# Altium schematic symbol library Sang_library.SchLib: 1607 symbols (part 9 of 15)
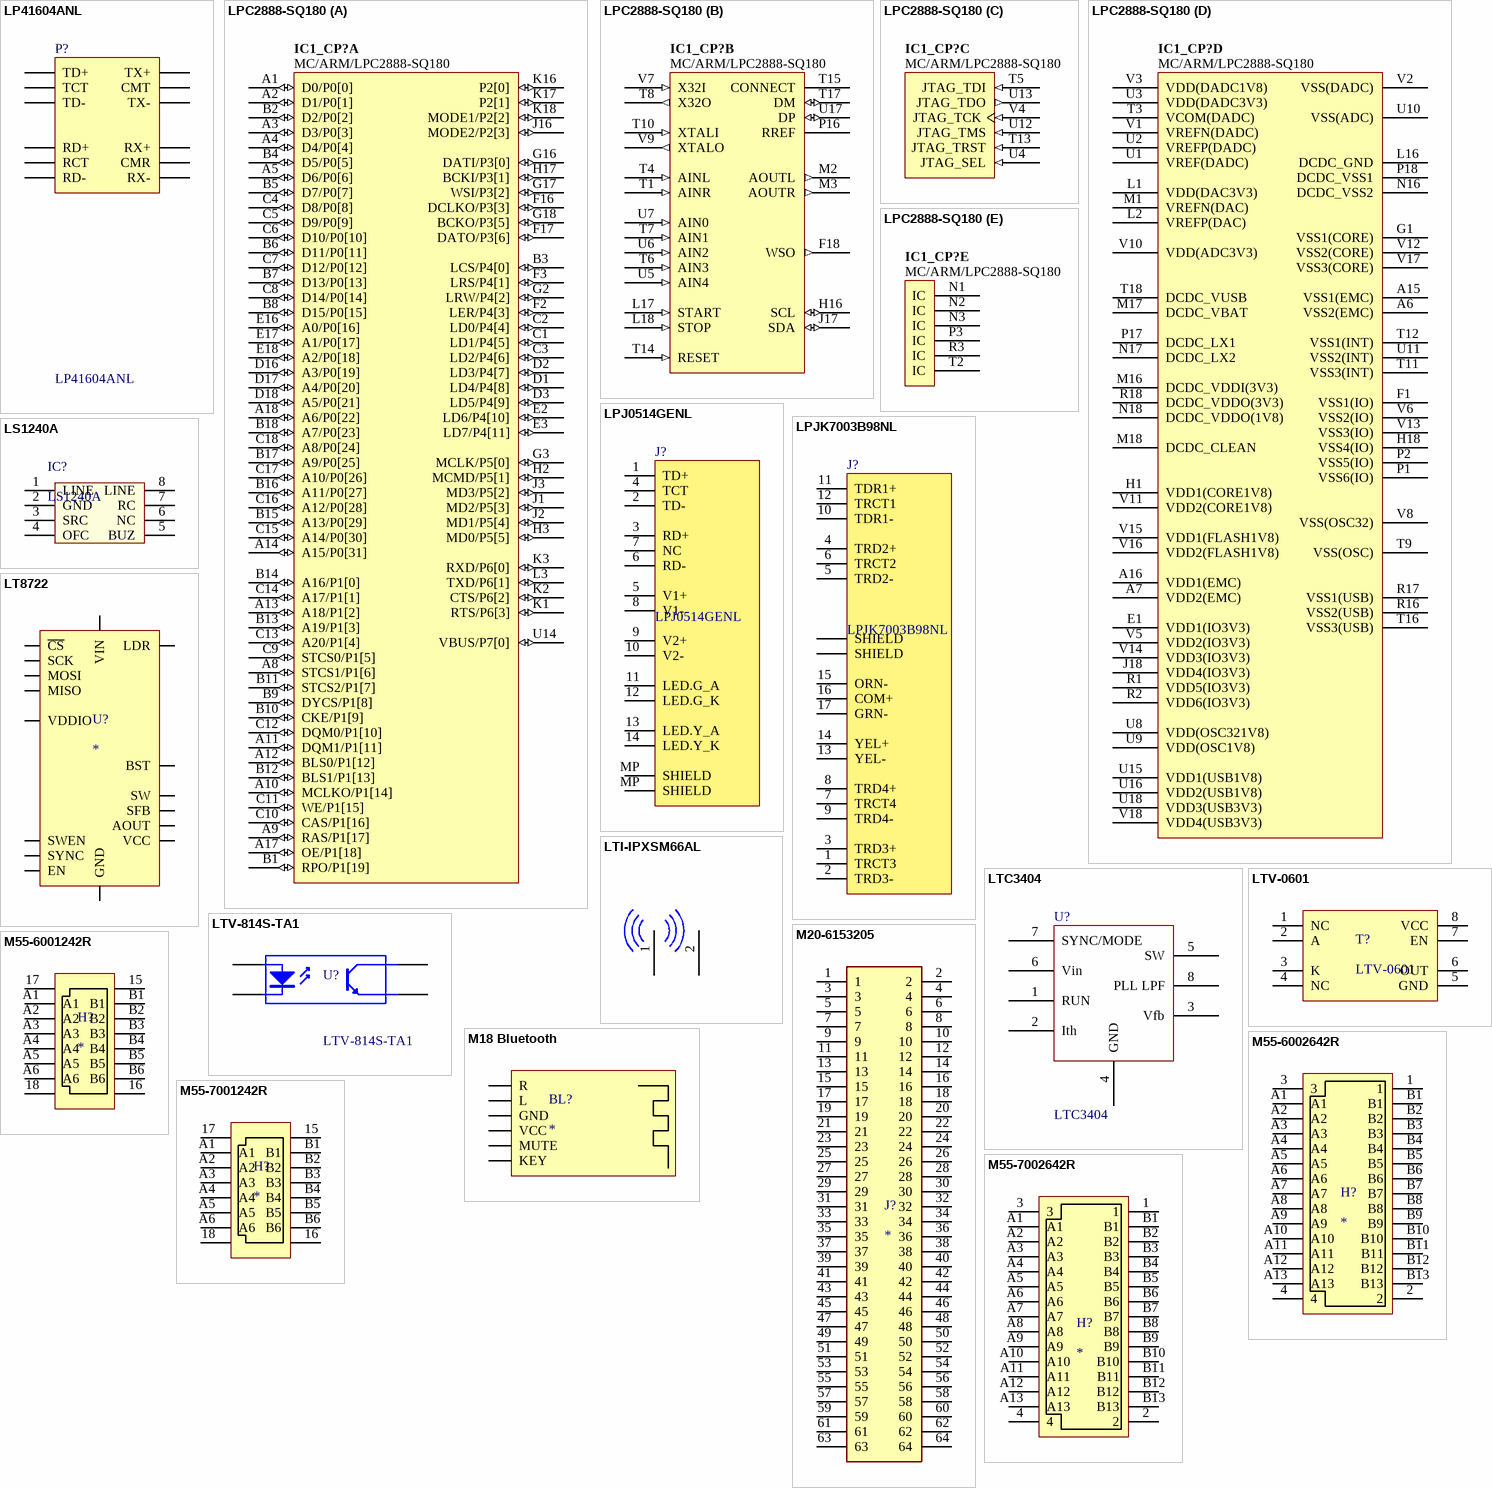
[diagram p105: symbols LP41604ANL to M55-7002642R]

## LPC2888-SQ180
designator IC1_CP?, comment MC/ARM/LPC2888-SQ180
16/32-bit ARM microcontrollers; 8 kB cache, up to 1 MB flash,  High Speed USB 2.0 device, and SDRAM memory interface; Bit Width: Bits; Max Clock Frequency: Hz; Supply Voltage: mV; Mounting Technology: Surface Mount; Status: Unreleased; Category: IC-MCU
footprint BGA180 (BGA, 180-Leads, Body 10x10mm, Pitch 0.5mm)
part A pins: A1 D0/P0[0] (io) "external memory data bus, low byte (I/O); GPIO pin", A2 D1/P0[1] (io) "external memory data bus, low byte (I/O); GPIO pin", A3 D3/P0[3] (io) "external memory data bus, low byte (I/O); GPIO pin", A4 D4/P0[4] (io) "external memory data bus, low byte (I/O); GPIO pin", A5 D6/P0[6] (io) "external memory data bus, low byte (I/O); GPIO pin", A8 STCS1/P1[6] (io) "chip select, active LOW for static memory bank 1; GPIO pin", A9 RAS/P1[17] (io) "row address strobe, active LOW for SDRAM; GPIO pin", A10 MCLKO/P1[14] (io) "clock for SDRAM and SyncFlash memory; GPIO pin", A11 DQM1/P1[11] (io) "data mask output for D[15:8], active HIGH for SDRAM; GPIO pin", A12 BLS0/P1[12] (io) "byte lane select for D[7:0], active LOW for static memory; GPIO pin", A13 A18/P1[2] (io) "address bus for static memory; GPIO pins", A14 A15/P0[31] (io) "address bus for static memory; GPIO pins", A17 OE/P1[18] (io) "output enable, active LOW for static memory; GPIO pin", A18 A6/P0[22] (io) "address bus for SDRAM and static memory; GPIO pins", B1 RPO/P1[19] (io) "reset power down, active LOW for SyncFlash memory; GPIO pin", B2 D2/P0[2] (io) "external memory data bus, low byte (I/O); GPIO pin", B3 LCS/P4[0] (io) "chip select to LCD device, programmable polarity; 5 V tolerant GPIO pin", B4 D5/P0[5] (io) "external memory data bus, low byte (I/O); GPIO pin", B5 D7/P0[7] (io) "external memory data bus, low byte (I/O); GPIO pin", B6 D11/P0[11] (io) "external memory data bus, high byte (I/O); GPIO pin", B7 D13/P0[13] (io) "external memory data bus, high byte (I/O); GPIO pin", B8 D15/P0[15] (io) "external memory data bus, high byte (I/O); GPIO pin", B9 DYCS/P1[8] (io) "chip select, active LOW for SDRAM; GPIO pin", B10 CKE/P1[9] (io) "clock enable; active HIGH for SDRAM; GPIO pin", B11 STCS2/P1[7] (io) "chip select, active LOW for static memory bank 2; GPIO pin", B12 BLS1/P1[13] (io) "byte lane select for D[15:8], active LOW for static memory; GPIO pin", B13 A19/P1[3] (io) "address bus for static memory; GPIO pins", B14 A16/P1[0] (io) "address bus for static memory; GPIO pins", B15 A13/P0[29] (io) "address bus for SDRAM and static memory; GPIO pins", B16 A11/P0[27] (io) "address bus for SDRAM and static memory; GPIO pins", B17 A9/P0[25] (io) "address bus for SDRAM and static memory; GPIO pins", B18 A7/P0[23] (io) "address bus for SDRAM and static memory; GPIO pins", C1 LD1/P4[5] (io) "data bus to/from LCD (I/O) or 5 V tolerant GPIO pin", C2 LD0/P4[4] (io) "data bus to/from LCD (I/O) or 5 V tolerant GPIO pin", C3 LD2/P4[6] (io) "data bus to/from LCD (I/O) or 5 V tolerant GPIO pin", C4 D8/P0[8] (io) "external memory data bus, high byte (I/O); GPIO pin", C5 D9/P0[9] (io) "external memory data bus, high byte (I/O); GPIO pin", C6 D10/P0[10] (io) "external memory data bus, high byte (I/O); GPIO pin", C7 D12/P0[12] (io) "external memory data bus, high byte (I/O); GPIO pin", C8 D14/P0[14] (io) "external memory data bus, high byte (I/O); GPIO pin", C9 STCS0/P1[5] (io) "chip select, active LOW for static memory bank 0; GPIO pin", C10 CAS/P1[16] (io) "column address strobe, active LOW for SDRAM; GPIO pin", C11 WE/P1[15] (io) "write enable, active LOW for SDRAM and static memory; GPIO pin", C12 DQM0/P1[10] (io) "data mask output for D[7:0], active HIGH for SDRAM; GPIO pin", C13 A20/P1[4] (io) "address bus for static memory; GPIO pins", C14 A17/P1[1] (io) "address bus for static memory; GPIO pins", C15 A14/P0[30] (io) "address bus for SDRAM and static memory; GPIO pins", C16 A12/P0[28] (io) "address bus for SDRAM and static memory; GPIO pins", C17 A10/P0[26] (io) "address bus for SDRAM and static memory; GPIO pins", C18 A8/P0[24] (io) "address bus for SDRAM and static memory; GPIO pins", D1 LD4/P4[8] (io) "data bus to/from LCD (I/O) or 5 V tolerant GPIO pin", D2 LD3/P4[7] (io) "data bus to/from LCD (I/O) or 5 V tolerant GPIO pin", D3 LD5/P4[9] (io) "data bus to/from LCD (I/O) or 5 V tolerant GPIO pin", D16 A3/P0[19] (io) "address bus for SDRAM and static memory; GPIO pins", D17 A4/P0[20] (io) "address bus for SDRAM and static memory; GPIO pins", D18 A5/P0[21] (io) "address bus for SDRAM and static memory; GPIO pins", E2 LD6/P4[10] (io) "data bus to/from LCD (I/O) or 5 V tolerant GPIO pin", E3 LD7/P4[11] (io) "data bus to/from LCD (I/O) or 5 V tolerant GPIO pin", E16 A0/P0[16] (io) "address bus for SDRAM and static memory; GPIO pins", E17 A1/P0[17] (io) "address bus for SDRAM and static memory; GPIO pins", E18 A2/P0[18] (io) "address bus for SDRAM and static memory; GPIO pins", F2 LER/P4[3] (io) "6800 E or 8080 RDor 5 V tolerant GPIO pin", F3 LRS/P4[1] (io) "‘HIGH?data register select, ‘LOW?instruction register select, or 5 V tolerant GPIO pin", F16 DCLKO/P3[3] (io) "256 ×clock output; 5 V tolerant GPIO pin", F17 DATO/P3[6] (io) "DAO serial data output; 5 V tolerant GPIO pin", G2 LRW/P4[2] (io) "6800 W/Ror 8080 WRor 5 V tolerant GPIO pin", G3 MCLK/P5[0] (io) "MCI clock output; 5 V tolerant GPIO pin", G16 DATI/P3[0] (io) "DAI serial data input; 5 V tolerant GPIO pin", G17 WSI/P3[2] (io) "DAI word select; 5 V tolerant GPIO pin", G18 BCKO/P3[5] (io) "DAO bit clock; 5 V tolerant GPIO pin", H2 MCMD/P5[1] (io) "command (I/O); 5 V tolerant GPIO pin", H3 MD0/P5[5] (io) "data bus from/to MCI/SD card (I/O); 5 V tolerant GPIO pin", H17 BCKI/P3[1] (io) "DAI bit clock; 5 V tolerant GPIO pin", J1 MD2/P5[3] (io) "data bus from/to MCI/SD card (I/O); 5 V tolerant GPIO pin", J2 MD1/P5[4] (io) "data bus from/to MCI/SD card (I/O); 5 V tolerant GPIO pin", J3 MD3/P5[2] (io) "data bus from/to MCI/SD card (I/O); 5 V tolerant GPIO pin", J16 MODE2/P2[3] (io) "start up MODE PIN2 (pull down); 5 V tolerant GPIO pin", K1 RTS/P6[3] (io) "request to send or receive flow control, active LOW; 5 V tolerant GPIO pin", K2 CTS/P6[2] (io) "clear to send or transmit flow control, active LOW; 5 V tolerant GPIO pin", K3 RXD/P6[0] (io) "serial input; 5 V tolerant GPIO pin", K16 P2[0] (io) "5 V tolerant GPIO pin", K17 P2[1] (io) "5 V tolerant GPIO pin", K18 MODE1/P2[2] (io) "start up MODE PIN1 (pull down); 5 V tolerant GPIO pin", L3 TXD/P6[1] (io) "serial output; 5 V tolerant GPIO pin", U14 VBUS/P7[0] (io) "USB supply detection; 5 V tolerant GPIO pin"
part B pins: F18 WSO (out) "DAO word select; 5 V tolerant pin", H16 SCL (io) "serial clock (input/open-drain output); 5 V tolerant pin", J17 SDA (io) "serial data (input/open-drain output); 5 V tolerant pin", L17 START (in) "DC-to-DC converter activation", L18 STOP (in) "DC-to-DC converter deactivation", M2 AOUTL (out) "DAC L analog out", M3 AOUTR (out) "DAC R analog out", P16 RREF (power) "transceiver reference; connect an external 12 k.1? resistor to ground", T1 AINR (in) "analog R input channel", T4 AINL (in) "analog L input channel", T6 AIN3 (in) "multiplexed analog input", T7 AIN1 (in) "multiplexed analog input", T8 X32O (out) "32.768 kHz oscillator output", T10 XTALI (in) "main oscillator input", T14 RESET (in) "master reset, active LOW; 5 V tolerant pin", T15 CONNECT (power) "used for signalling speed capability; for high speed USB, connect an external 1.5 k.resistor to 3.3 V", T17 DM (io) "negative USB data line", U5 AIN4 (in) "multiplexed analog input", U6 AIN2 (in) "multiplexed analog input", U7 AIN0 (in) "multiplexed analog input", U17 DP (io) "positive USB data line", V7 X32I (in) "32.768 kHz oscillator input", V9 XTALO (out) "main oscillator output"
part C pins: T5 JTAG_TDI (in) "JTAG data input (pull-up); 5 V tolerant pin", T13 JTAG_TRST (in) "JTAG reset input (pull-down); 5 V tolerant pin", U4 JTAG_SEL (in) "JTAG selection (pull-down); 5 V tolerant pin", U12 JTAG_TMS (in) "JTAG mode select input (pull-up); 5 V tolerant pin", U13 JTAG_TDO (out) "JTAG data output; 5 V tolerant pin", V4 JTAG_TCK (in) "JTAG reset input (pull-down); 5 V tolerant pin"
part D pins: A6 VSS2(EMC) (power) "ground for external memory controller", A7 VDD2(EMC) (power) "1.8 V or 3.3 V for external memory controller", A15 VSS1(EMC) (power) "ground for external memory controller", A16 VDD1(EMC) (power) "1.8 V or 3.3 V for external memory controller", E1 VDD1(IO3V3) (power) "3.3 V for peripherals", F1 VSS1(IO) (power) "ground for peripherals", G1 VSS1(CORE) (power) "ground for internal RAM and ROM", H1 VDD1(CORE1V8) (power) "1.8 V for internal RAM and ROM", H18 VSS4(IO) (power) "ground for peripherals", J18 VDD4(IO3V3) (power) "3.3 V for peripherals", L1 VDD(DAC3V3) (power) "3.3 V for DAC", L2 VREFP(DAC) (power) "positive reference voltage", L16 DCDC_GND (power) "DC-to-DC converter main ground and substrate", M1 VREFN(DAC) (power) "negative reference voltage", M16 DCDC_VDDI(3V3) (power) "DC/DC1 3.3 V input voltage", M17 DCDC_VBAT (power) "connect to battery +", M18 DCDC_CLEAN (power) "reference circuit ground, not connected to substrate", N16 DCDC_VSS2 (power) "ground for DC/DC2, not connected to substrate", N17 DCDC_LX2 (power) "connect to external coil for DC/DC2", N18 DCDC_VDDO(1V8) (power) "DC/DC2 1.8 V output voltage", P1 VSS6(IO) (power) "ground for peripherals", P2 VSS5(IO) (power) "ground for peripherals", P17 DCDC_LX1 (power) "connect to external coil for DC/DC1", P18 DCDC_VSS1 (power) "ground for DC/DC1, not connected to substrate", R1 VDD5(IO3V3) (power) "3.3 V for peripherals", R2 VDD6(IO3V3) (power) "3.3 V for peripherals", R16 VSS2(USB) (power) "analog ground", R17 VSS1(USB) (power) "analog ground", R18 DCDC_VDDO(3V3) (power) "DC/DC1 3.3 V output voltage", T3 VCOM(DADC) (power) "ADC common reference voltage and analog output reference voltage combined on-chip", T9 VSS(OSC) (power) "ground", T11 VSS3(INT) (power) "ground for other internal blocks", T12 VSS1(INT) (power) "ground for other internal blocks", T16 VSS3(USB) (power) "analog ground", T18 DCDC_VUSB (power) "connect to +5 V pin of USB connector", U1 VREF(DADC) (power) "ADC reference voltage", U2 VREFP(DADC) (power) "ADC positive reference voltage", U3 VDD(DADC3V3) (power) "3.3 V for dual ADC", U8 VDD(OSC321V8) (power) "1.8 V", U9 VDD(OSC1V8) (power) "1.8 V", U10 VSS(ADC) (power) "ground", U11 VSS2(INT) (power) "ground for other internal blocks", U15 VDD1(USB1V8) (power) "analog 1.8 V", U16 VDD2(USB1V8) (power) "analog 1.8 V", U18 VDD3(USB3V3) (power) "analog 3.3 V", V1 VREFN(DADC) (power) "ADC negative reference voltage", V2 VSS(DADC) (power) "ground for dual ADC", V3 VDD(DADC1V8) (power) "1.8 V for dual ADC", V5 VDD2(IO3V3) (power) "3.3 V for peripherals", V6 VSS2(IO) (power) "ground for peripherals", V8 VSS(OSC32) (power) "ground", V10 VDD(ADC3V3) (power) "3.3 V analog supply and reference voltage", V11 VDD2(CORE1V8) (power) "1.8 V for core", V12 VSS2(CORE) (power) "ground for core", V13 VSS3(IO) (power) "ground for peripherals", V14 VDD3(IO3V3) (power) "3.3 V for peripherals", V15 VDD1(FLASH1V8) (power) "1.8 V for internal flash memory", V16 VDD2(FLASH1V8) (power) "1.8 V for internal flash memory", V17 VSS3(CORE) (power) "ground for core, substrate, flash", V18 VDD4(USB3V3) (power) "analog 3.3 V"
part E pins: N1 IC "This pin connected internally and must be left unconnected in an application.", N2 IC "This pin connected internally and must be left unconnected in an application.", N3 IC "This pin connected internally and must be left unconnected in an application.", P3 IC "This pin connected internally and must be left unconnected in an application.", R3 IC "This pin connected internally and must be left unconnected in an application.", T2 IC "This pin connected internally and must be left unconnected in an application."

## LPJ0514GENL
designator J?
LINK-PP LPJ0514GENL  RJ-45 Connector; Value: RJ45 POE; Solder: WAVE; MPN: LPJ0514GENL; MFR: LINK-PP
footprint LPJ0514GENL (Footprint not found)
pins: 1 TD+, 2 TD-, 3 RD+, 4 TCT, 5 V1+, 6 RD-, 7 NC, 8 V1-, 9 V2+, 10 V2-, 11 LED.G_A, 12 LED.G_K, 13 LED.Y_A, 14 LED.Y_K, MP SHIELD, MP SHIELD

## LPJK7003B98NL
designator J?
Ethernet Connectors 1x1 LOW PROFILE , GIGABIT; MFR: LinkPP; Solder: WAVE; MPN: LPJK7003B98NL; Value: LPJK7003B98NL
footprint LPJK7003B98NL
pins: 1 TRCT3, 2 TRD3-, 3 TRD3+, 4 TRD2+, 5 TRD2-, 6 TRCT2, 7 TRCT4, 8 TRD4+, 9 TRD4-, 10 TDR1-, 11 TDR1+, 12 TRCT1, 13 YEL-, 14 YEL+, 15 ORN-, 16 COM+, 17 GRN-, SH1 SHIELD (power), SH2 SHIELD (power)

## LS1240A
designator IC?
Electronic Two-Tone Ringer
footprint DIP8
footprint SO8
pins: 1 LINE, 2 GND, 3 SRC, 4 OFC, 5 BUZ, 6 NC, 7 RC, 8 LINE

## LT8722
designator U?
footprint QFN18
pins: 1 SYNC, 2 VCC, 3 BST, 4,11 VIN, 5,10,21,22 GND, 6,7 SW, 8,9 LDR, 12 SFB, 13 SWEN, 14 VDDIO, 15 ~{CS}, 16 SCK, 17 MOSI, 18 MISO, 19 EN, 20 AOUT

## LTC3404
designator U?
SYNCHRONOUS SWITCHER CONTROLLER; Supplier 1: Digi-Key; Supplier Part Number 1: LTC3404EMS8#PBF-ND
footprint MSOP8 (MSOP, 8-Leads, Body 3.00x3.00mm, Pitch 0.65mm, IPC High Density)
footprint DIP8
pins: 1 RUN, 2 Ith, 3 Vfb, 4 GND, 5 SW, 6 Vin, 7 SYNC/MODE, 8 PLL LPF

## LTI-IPXSM66AL
designator AT?, comment IPEX_CON  (value not drawn)
IPEX CONNECTER ANTENNA GPS GSM; MPN: LTI-IPXSM66AL; Solder: SMT; Value: IPEX_CON
footprint U.FL/UMCC (U.FL (UMCC) Connector Jack, Male Pin 50Ohm Surface Mount Solder)
pins: 1 AT, 2 0

## LTV-0601
designator T?
OPTOISO 3.75KV OPN COLLECTOR 8SO; MFR: Lite-On Inc.; Solder: SMT; Value: LTV-0601; MPN: LTV-0601; PinCount: 8
footprint DMP8 (TSOP, 8-Leads, Body 5.00x5.00mm, Pitch 1.27mm, IPC Medium Density)
pins: 1 NC, 2 A, 3 K, 4 NC, 5 GND, 6 OUT, 7 EN, 8 VCC

## LTV-814S-TA1
designator U?
OPTOISOLATR 5KV TRANSISTOR 4-SMD; MFR: Lite-On Inc.; Solder: SMT; MPN: LTV-814S-TA1; Value: LTV-814S-TA1
footprint OPTO TRANSISTOR_SMD-4
pins: 1, 2, 3, 4

## M18 Bluetooth
designator BL?
footprint M18 Bluetooth
pins: 1 R, 2 L, 3 GND, 4 VCC, 5 MUTE, 6 KEY

## M20-6153205
designator J?
footprint M20-6153205
pins: 1, 2, 3, 4, 5, 6, 7, 8, 9, 10, 11, 12, 13, 14, 15, 16, 17, 18, 19, 20, 21, 22, 23, 24, 25, 26, 27, 28, 29, 30, 31, 32, 33, 34, 35, 36, 37, 38, 39, 40, 41, 42, 43, 44, 45, 46, 47, 48, 49, 50, 51, 52, 53, 54, 55, 56, 57, 58, 59, 60, 61, 62, 63, 64

## M55-6001242R
designator H?
footprint M55-6001242R (CONN RCPT 12POS 0.05 GOLD SMD)
pins: 15, 16, 17, 18, A1, A2, A3, A4, A5, A6, B1, B2, B3, B4, B5, B6

## M55-6002642R
designator H?
footprint M55-6002642R (CONN RCPT 26POS 0.05 GOLD SMD)
pins: 1, 2, 3, 4, A1, A2, A3, A4, A5, A6, A7, A8, A9, A10, A11, A12, A13, B1, B2, B3, B4, B5, B6, B7, B8, B9, B10, B11, B12, B13

## M55-7001242R
designator H?
footprint M55-7001242R (CONN HEADER SMD 12POS 1.27MM)
pins: 15, 16, 17, 18, A1, A2, A3, A4, A5, A6, B1, B2, B3, B4, B5, B6

## M55-7002642R
designator H?
footprint M55-7002642R (CONN HEADER SMD 26POS 1.27MM)
pins: 1, 2, 3, 4, A1, A2, A3, A4, A5, A6, A7, A8, A9, A10, A11, A12, A13, B1, B2, B3, B4, B5, B6, B7, B8, B9, B10, B11, B12, B13

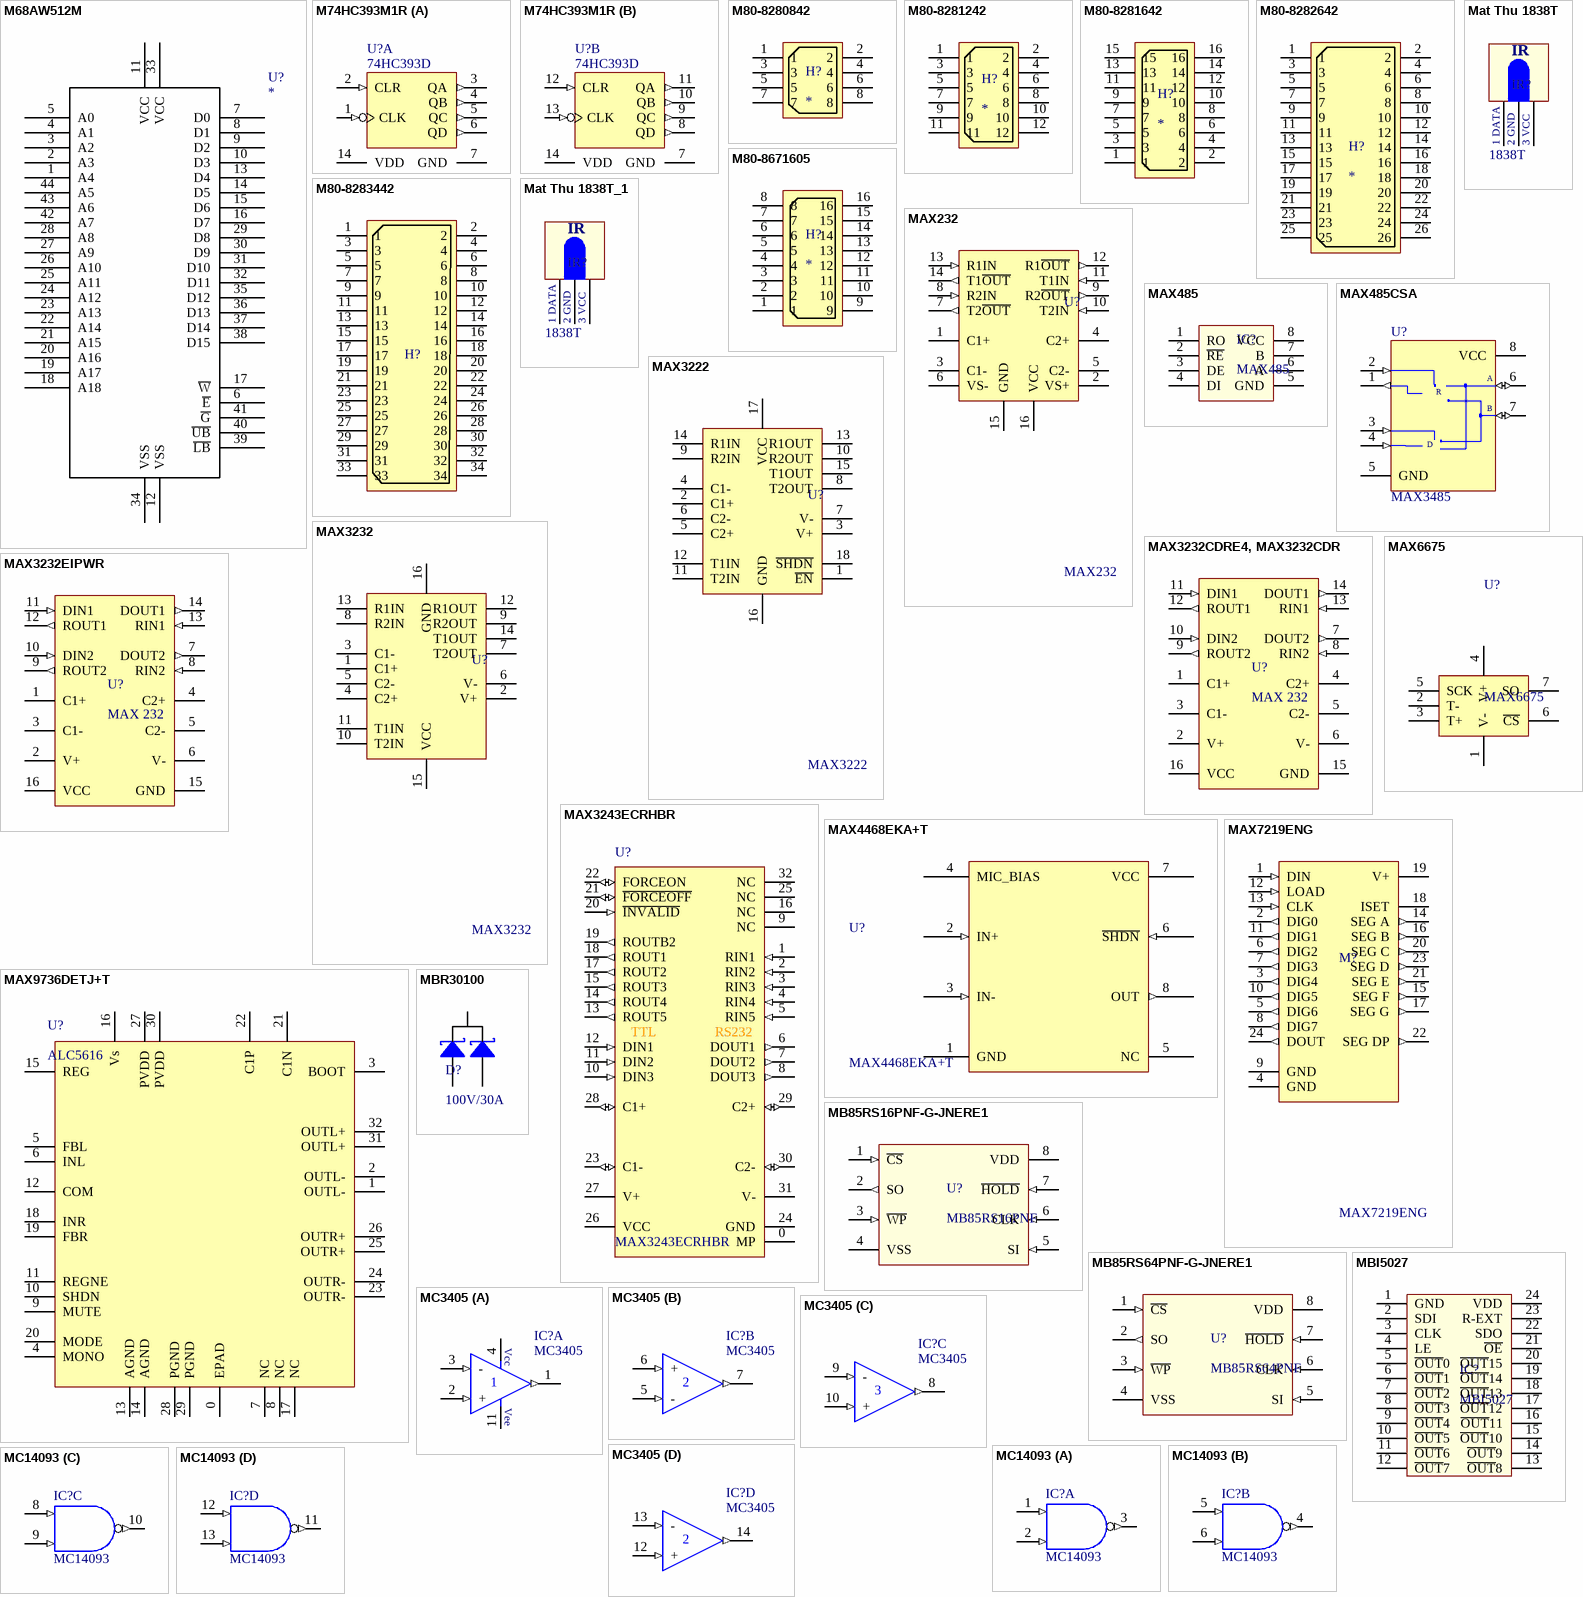
[diagram p53: symbols M68AW512M to MC14093]

## M68AW512M
designator U?
512K X 16 ASYNCHRONUS SRAM ST MICROELECTRONICS
footprint TSOP44-II (TSOP-II, 44-Leads, Body 18.41x10.16mm, Pitch 0.80mm, IPC High Density)
pins: 1 A4, 2 A3, 3 A2, 4 A1, 5 A0, 6 ~{E}, 7 D0, 8 D1, 9 D2, 10 D3, 11 VCC, 12 VSS, 13 D4, 14 D5, 15 D6, 16 D7, 17 ~{W}, 18 A18, 19 A17, 20 A16, 21 A15, 22 A14, 23 A13, 24 A12, 25 A11, 26 A10, 27 A9, 28 A8, 29 D8, 30 D9, 31 D10, 32 D11, 33 VCC, 34 VSS, 35 D12, 36 D13, 37 D14, 38 D15, 39 ~{LB}, 40 ~{UB}, 41 ~{G}, 42 A7, 43 A6, 44 A5

## M74HC393M1R
designator U?, comment 74HC393D
Dual Binary Counter; MPN: 74HC393D,653; Solder: SMT; Value: 74HC393D; Category: IC
footprint SOIC-14 (Small Outline IC (SOIC), 1.27 mm pitch; 14 pin, 8.65 mm L X 3.90 mm W X 1.75 mm H body)
pins on every part: 7 GND (power) hidden to GND, 14 VDD (power) hidden to VDD
part A pins: 1 CLK (in), 2 CLR (in), 3 QA (out), 4 QB (out), 5 QC (out), 6 QD (out)
part B pins: 8 QD (out), 9 QC (out), 10 QB (out), 11 QA (out), 12 CLR (in), 13 CLK (in)

## M80-8280842
designator H?
CONN HEADER SMD 8POS 2MM
footprint m80-8280842 (CONN HEADER SMD 8POS 2MM)
pins: 1, 2, 3, 4, 5, 6, 7, 8

## M80-8281242
designator H?
CONN HEADER SMD 12POS 2MM
footprint M80-8281242 (CONN HEADER SMD 12POS 2MM)
pins: 1, 2, 3, 4, 5, 6, 7, 8, 9, 10, 11, 12

## M80-8281642
designator H?
CONN HEADER SMD 16POS 2MM
footprint M80-8281642
pins: 1, 2, 3, 4, 5, 6, 7, 8, 9, 10, 11, 12, 13, 14, 15, 16

## M80-8282642
designator H?
CONN HEADER SMD 26POS 2MM
footprint M80-8282642 (CONN HEADER SMD 26POS 2MM)
pins: 1, 2, 3, 4, 5, 6, 7, 8, 9, 10, 11, 12, 13, 14, 15, 16, 17, 18, 19, 20, 21, 22, 23, 24, 25, 26

## M80-8283442
designator H?  (value not drawn)
CONN HEADER SMD 34POS 2MM
footprint M80-8283442
pins: 1, 2, 3, 4, 5, 6, 7, 8, 9, 10, 11, 12, 13, 14, 15, 16, 17, 18, 19, 20, 21, 22, 23, 24, 25, 26, 27, 28, 29, 30, 31, 32, 33, 34

## M80-8671605
designator H?
footprint M80-8671605 (DATAMATE L-TEK DIL MALE VERTICAL)
pins: 1, 2, 3, 4, 5, 6, 7, 8, 9, 10, 11, 12, 13, 14, 15, 16

## Mat Thu 1838T
designator IR?  (value not drawn)
footprint IR (Receiver Infared IC)
pins: 1 DATA, 2 GND, 3 VCC
text: IR; 1 DATA; 2 GND; 3 VCC; 1838T

## Mat Thu 1838T_1
designator IR?, comment Mat Thu 1838T  (value not drawn)
footprint IR (Receiver Infared IC)
pins: 1 DATA, 2 GND, 3 VCC
text: IR; 1 DATA; 2 GND; 3 VCC; 1838T

## MAX232
designator U?
RS232 LEVEL SHIFTER; Manufacturer Part Number: MAX232DR; Manufacturer: Texas Instruments; Number of Drivers/Receivers: 2/2; Voltage - Supply: 4.5 V ~ 5.5 V; Supplier 1: Digi-Key; Supplier Part Number 1: 296-14619-1-ND; RoHS: RoHS Compliant; Packaging: Cut Tape (CT); Protocol: RS232; Type: Transceiver; Supplier Part Number: 296-14619-1-ND; Supplier: Digi-Key; Category: Integrated Circuits (ICs); Package / Case: 16-SOIC (3.9mm Width)
footprint SO16 (SOIC, 16-Leads, Body 9.90x3.91mm, Pitch 1.27mm, IPC Medium Density)
footprint DIP16
pins: 1 C1+, 2 VS+ (power), 3 C1-, 4 C2+, 5 C2-, 6 VS- (power), 7 T2~{OUT} (out), 8 R2IN (in), 9 R2~{OUT} (out), 10 T2IN (in), 11 T1IN (in), 12 R1~{OUT} (out), 13 R1IN (in), 14 T1~{OUT} (out), 15 GND (power), 16 VCC (power)

## MAX485
designator IC?
RS232 - RS485 (Same sn75176)
footprint DIP8
footprint SO8 (SOIC, 8-Leads, Body 4.9x3.9mm, Pitch 1.27mm, IPC High Density)
pins: 1 RO "Receiver Output", 2 ~{RE} "Receiver Enable Output", 3 DE "Driver Enable Output", 4 DI "Driver Input", 5 GND, 6 A "RI & NoneDO", 7 B "NoneDI", 8 VCC

## MAX485CSA
designator U?, comment MAX3485
Low-Power, Slew-Rate-Limited RS-485/RS-422 Transceiver; MPN: MAX3485ESA; Value: MAX485; Solder: SMT; Category: IC
footprint SOIC-8
pins: 1 RO (out), 2 ~{RE} (in), 3 DE (in), 4 DI (in), 5 GND (power), 6 A (io), 7 B (io), 8 VCC (power)
text: R; D

## MAX3222
designator U?
Manufacturer Part Number: MAX232DR; Manufacturer: Texas Instruments; Protocol: RS232; Number of Drivers/Receivers: 2/2; Voltage - Supply: 4.5 V ~ 5.5 V; Supplier 1: Digi-Key; Supplier Part Number 1: 296-14619-1-ND; RoHS: RoHS Compliant; Packaging: Cut Tape (CT); Type: Transceiver; Supplier Part Number: 296-14619-1-ND; Supplier: Digi-Key; Category: Integrated Circuits (ICs); Package / Case: 16-SOIC (3.9mm Width)
footprint DIP18 (DIP; 18 Leads; Row Spacing 7.62 mm; Pitch 2.54 mm)
footprint SO18 (SOIC, 18-Leads, Body 11.50x7.50mm, Pitch 1.27mm, IPC Medium Density)
pins: 1 ~{EN}, 2 C1+ (power), 3 V+, 4 C1-, 5 C2+, 6 C2- (power), 7 V-, 8 T2OUT, 9 R2IN, 10 R2OUT, 11 T2IN, 12 T1IN, 13 R1OUT, 14 R1IN, 15 T1OUT (power), 16 GND (power), 17 VCC (power), 18 ~{SHDN} (power)

## MAX3232
designator U?
Manufacturer Part Number: MAX232DR; Manufacturer: Texas Instruments; Protocol: RS232; Number of Drivers/Receivers: 2/2; Voltage - Supply: 4.5 V ~ 5.5 V; Supplier 1: Digi-Key; Supplier Part Number 1: 296-14619-1-ND; RoHS: RoHS Compliant; Packaging: Cut Tape (CT); Type: Transceiver; Supplier Part Number: 296-14619-1-ND; Supplier: Digi-Key; Category: Integrated Circuits (ICs); Package / Case: 16-SOIC (3.9mm Width)
footprint DIP16
footprint SO16 (SOIC, 16-Leads, Body 9.90x3.91mm, Pitch 1.27mm, IPC Medium Density)
pins: 1 C1+ (power), 2 V+, 3 C1-, 4 C2+, 5 C2- (power), 6 V-, 7 T2OUT, 8 R2IN, 9 R2OUT, 10 T2IN, 11 T1IN, 12 R1OUT, 13 R1IN, 14 T1OUT (power), 15 VCC (power), 16 GND (power)

## MAX3232CDRE4, MAX3232CDR
designator U?, comment MAX 232
IC DRVR/RCVR MULTCH RS232 16SOIC; MPN: MAX3232CDRE4, MAX3232CDR; Solder: SMT; Value: MAX 232; Category: IC
footprint SOIC-16 (Small Outline IC (SOIC), 1.27 mm pitch; 16 pin, 9.90 mm L X 4.00 mm W X 1.75 mm H body)
pins: 1 C1+, 2 V+ (power), 3 C1-, 4 C2+, 5 C2-, 6 V- (power), 7 DOUT2 (out), 8 RIN2 (in), 9 ROUT2 (out), 10 DIN2 (in), 11 DIN1 (in), 12 ROUT1 (out), 13 RIN1 (in), 14 DOUT1 (out), 15 GND (power), 16 VCC (power)

## MAX3232EIPWR
designator U?, comment MAX 232
IC RS232 LINE DVR/RCVR 16TSSOP; MPN: MAX3232EIPWR; Solder: SMT; Value: MAX 232; Category: IC
footprint TI-PW16_N (TSOP, 16-Leads, Body 5x4.4mm, Pitch 0.65mm, IPC Medium Density)
pins: 1 C1+, 2 V+ (power), 3 C1-, 4 C2+, 5 C2-, 6 V- (power), 7 DOUT2 (out), 8 RIN2 (in), 9 ROUT2 (out), 10 DIN2 (in), 11 DIN1 (in), 12 ROUT1 (out), 13 RIN1 (in), 14 DOUT1 (out), 15 GND (power), 16 VCC (power)

## MAX3243ECRHBR
designator U?
IC TRANSCEIVER FULL 3/5 32FN; MF: Maxim Integrated; MP: MAX3243EEUI+; Package: TSSOP-28 Maxim; Price: None; Availability: Unavailable; SnapEDA_Link: https://www.snapeda.com/parts/MAX3243EEUI%2B/Maxim%20Integrated/view-part/991547/?ref=snap; Value: *
footprint QFN50P500X500X100-33N
pins: 0 MP, 1 RIN1 (in), 2 RIN2 (in), 3 RIN3 (in), 4 RIN4 (in), 5 RIN5 (in), 6 DOUT1 (out), 7 DOUT2 (out), 8 DOUT3 (out), 9 NC, 10 DIN3 (in), 11 DIN2 (in), 12 DIN1 (in), 13 ROUT5 (out), 14 ROUT4 (out), 15 ROUT3 (out), 16 NC, 17 ROUT2 (out), 18 ROUT1 (out), 19 ROUTB2 (out), 20 ~{INVALID} (in), 21 ~{FORCEOFF} (io), 22 FORCEON (io), 23 C1- (io), 24 GND (power), 25 NC, 26 VCC (power), 27 V+ (power), 28 C1+ (io), 29 C2+ (io), 30 C2- (io), 31 V- (power), 32 NC
text: TTL; RS232

## MAX4468EKA+T
designator U?
IC AMP CLASS AB MONO SOT23-8; MFR: Maxim Integrated; Solder: SMT; MPN: MAX4468EKA+T; Value: MAX4468EKA+T; Category: IC; PinCount: 14
footprint SOT23-8_0.65MM
pins: 1 GND (power), 2 IN+ (in), 3 IN- (in), 4 MIC_BIAS (power), 5 NC (hiz), 6 ~{SHDN} (in), 7 VCC (power), 8 OUT (out)

## MAX6675
designator U?
Half-Bridge Driver
footprint DIP8
footprint SO8 (SOIC, 8-Leads, Body 4.9x3.9mm, Pitch 1.27mm, IPC High Density)
pins: 1 V-, 2 T-, 3 T+, 4 V+, 5 SCK, 6 ~{CS}, 7 SO

## MAX7219ENG
designator M?
Serially Interfaced, 8-Digit LED Display Driver; Published: 16-Jan-2001; LatestRevisionDate: 29-May-2009; LatestRevisionNote: Component Body Added.; DatasheetVersion: Jul-1997; PackageVersion: 1997; PackageReference: NG24A; Publisher: Altium Limited; PackageDescription: DIP, 24-Pin, Row Spacing 7.62 mm, Pitch 2.54 mm; Code_JEDEC: MS-001-AF; ComponentLink1Description: Manufacturer Link; ComponentLink1URL: http://www.maxim-ic.com/; ComponentLink2Description: Datasheet; ComponentLink2URL: http://pdfserv.maxim-ic.com/en/ds/MAX7219-MAX7221.pdf
footprint SO24 (SOP, 24-Leads, Body 15.6x8.1mm, Pitch 1.27mm, IPC Low Density)
footprint DIP24
pins: 1 DIN (in), 2 DIG0 (out), 3 DIG4 (out), 4 GND (power), 5 DIG6 (out), 6 DIG2 (out), 7 DIG3 (out), 8 DIG7 (out), 9 GND (power), 10 DIG5 (out), 11 DIG1 (out), 12 LOAD (in), 13 CLK (in), 14 SEG A (out), 15 SEG F (out), 16 SEG B (out), 17 SEG G (out), 18 ISET, 19 V+ (power), 20 SEG C (out), 21 SEG E (out), 22 SEG DP (out), 23 SEG D (out), 24 DOUT (out)

## MAX9736DETJ+T
designator U?, comment ALC5616
IC AMP D MONO/STEREO 17MW 32TQFN; MFR: Maxim; MPN: MAX9736DETJ+T; Solder: SMT; PinCount: 33
footprint VFQFN-32 (32-VFQFN Exposed Pad)
pins: 0 EPAD, 1 OUTL-, 2 OUTL-, 3 BOOT, 4 MONO, 5 FBL, 6 INL, 7 NC, 8 NC, 9 MUTE, 10 SHDN, 11 REGNE, 12 COM, 13 AGND, 14 AGND, 15 REG, 16 Vs, 17 NC, 18 INR, 19 FBR, 20 MODE, 21 C1N, 22 C1P, 23 OUTR-, 24 OUTR-, 25 OUTR+, 26 OUTR+, 27 PVDD, 28 PGND, 29 PGND, 30 PVDD, 31 OUTL+, 32 OUTL+

## MB85RS16PNF-G-JNERE1
designator U?, comment MB85RS16PNF
IC FRAM 16K SPI 20MHZ 8SOP; MPN: MB85RS16PNF-G-JNERE1; MFR: Fujitsu Electronics America, Inc.; Solder: SMT; Value: MB85RS16PNF; Category: IC; PinCount: 8
footprint SOIC-8
pins: 1 ~{CS} (in), 2 SO (out), 3 ~{WP} (in), 4 VSS (power), 5 SI (in), 6 CLK (in), 7 ~{HOLD} (in), 8 VDD (power)

## MB85RS64PNF-G-JNERE1
designator U?, comment MB85RS64PNF
IC FRAM 64K SPI 20MHZ 8SOP; MPN: MB85RS64PNF-G-JNERE1; MFR: Fujitsu Electronics America, Inc.; Solder: SMT; Value: MB85RS64PNF; Category: IC; PinCount: 8
footprint SOIC-8
pins: 1 ~{CS} (in), 2 SO (out), 3 ~{WP} (in), 4 VSS (power), 5 SI (in), 6 CLK (in), 7 ~{HOLD} (in), 8 VDD (power)

## MBI5027
designator IC?
16 bit Constant Current LED; Creat by: VanDungEvn@Gmail.com; Compoment same: SM16126
footprint SO24 (SOIC, 24-Leads, Body 15.30x7.50mm, Pitch 1.27mm, IPC Medium Density)
footprint DIP24
pins: 1 GND, 2 SDI, 3 CLK, 4 LE, 5 ~{OUT}0, 6 ~{OUT}1, 7 ~{OUT}2, 8 ~{OUT}3, 9 ~{OUT}4, 10 ~{OUT}5, 11 ~{OUT}6, 12 ~{OUT}7, 13 ~{OUT}8, 14 ~{OUT}9, 15 ~{OUT}10, 16 ~{OUT}11, 17 ~{OUT}12, 18 ~{OUT}13, 19 ~{OUT}14, 20 ~{OUT}15, 21 ~{OE}, 22 SDO, 23 R-EXT, 24 VDD

## MBR30100
designator D?, comment 100V/30A
MBR30100 Diode Schottky 30A 100V TO-220; Solder: WAVE; Value: 100V/30A; MPN: MBR30100; Category: DIODE
footprint TO220
pins: 1 A1, 2 K, 3 A2

## MC3405
designator IC?
Dual operation Ampllifier and dual comparator; Value: LM324
footprint DIP14
part A pins: 1 OUT (out), 2 + (in), 3 - (in), 4 V+ (power), 11 V- (power)
part B pins: 5 - (in), 6 + (in), 7 OUT (out)
part C pins: 8 OUT (out), 9 - (in), 10 + (in)
part D pins: 12 + (in), 13 - (in), 14 OUT (out)
part A text: Vcc; Vee

## MC14093
designator IC?
Quad 2-Input NAND Schmitt Trigger; Value: MC14093
footprint DIP14
footprint SO14
footprint TSSOP14 (TSSOP, 14-Leads, Body 5.00x4.40mm, Pitch 0.65mm, IPC High Density)
pins on every part: 7 GND (power) hidden to GND, 14 VDD (power) hidden to VDD
part A pins: 1 A (in), 2 B (in), 3 ~{Y} (out)
part B pins: 4 ~{Y} (out), 5 A (in), 6 B (in)
part C pins: 8 A (in), 9 B (in), 10 ~{Y} (out)
part D pins: 11 ~{Y} (out), 12 A (in), 13 B (in)

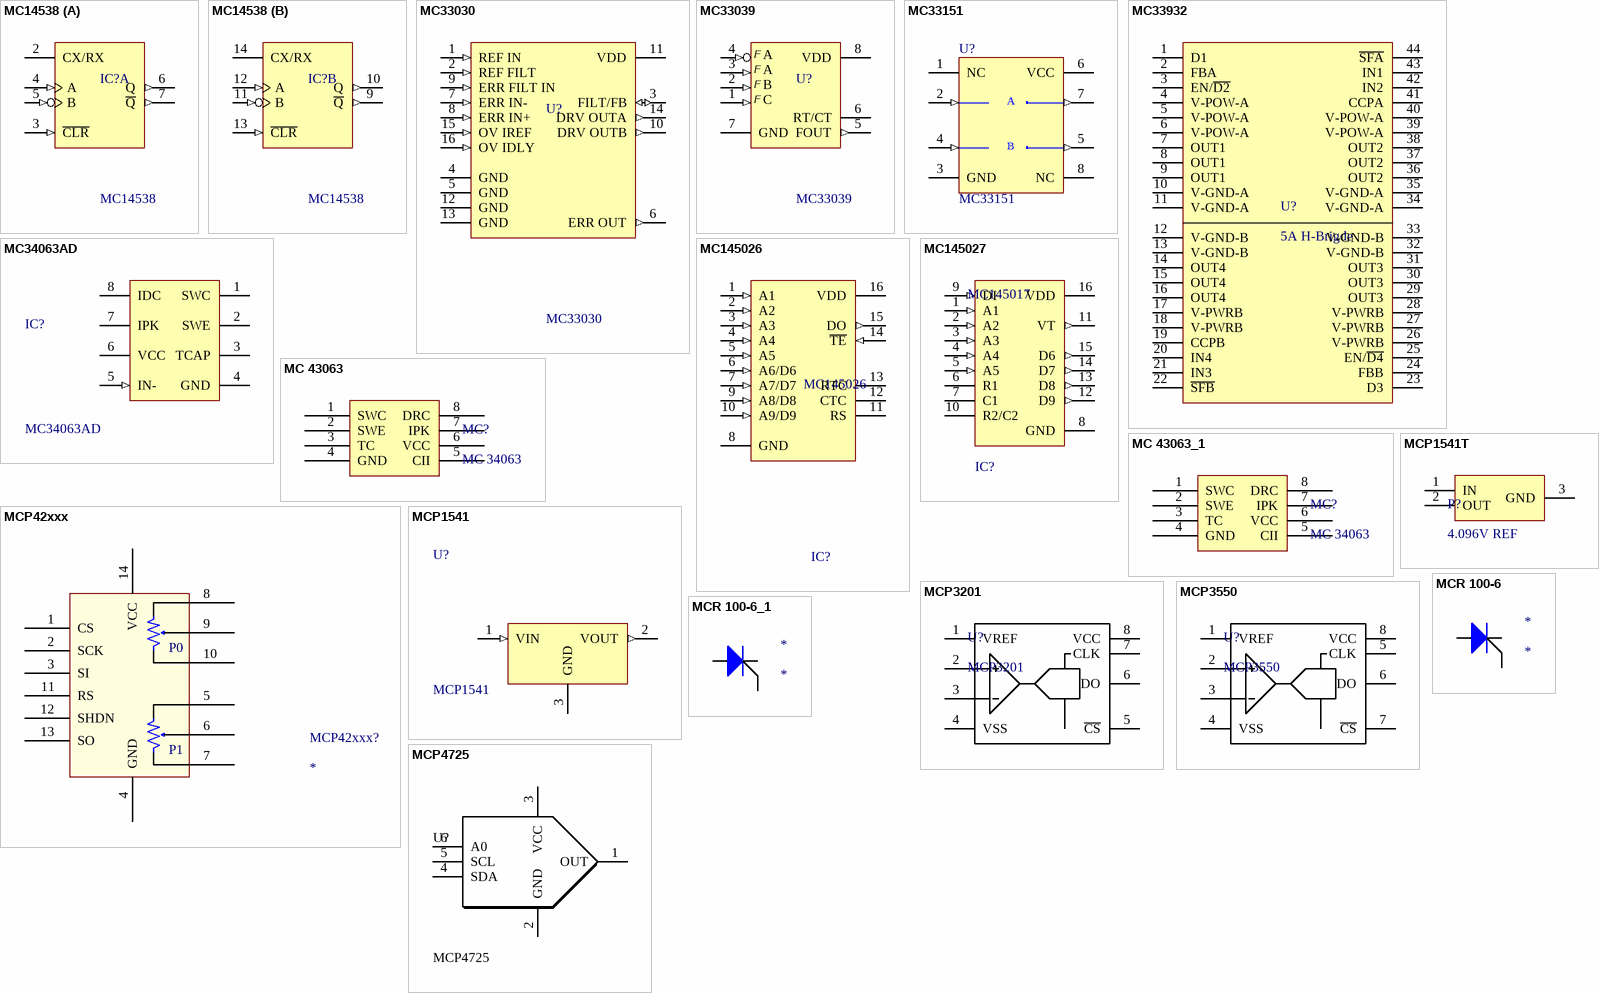
[diagram p54: symbols MC14538 to MCR 100-6_1]

## MC14538
designator IC?
Dual Precision Retriggerable/Resettable Monostable Multivibrator; Value: MC14538
footprint DIP16
footprint SO16 (SOIC, 16-Leads, Body 9.90x3.91mm, Pitch 1.27mm, IPC Medium Density)
footprint SO16L (SOIC, 16-Leads, Body 10.30x7.50mm, Pitch 1.27mm, IPC Medium Density)
footprint TSSOP16 (TSSOP, 16-Leads, Body 5.10x4.40mm, Pitch 0.65mm, IPC High Density)
pins on every part: 1 GND (power) hidden to GND, 8 GND (power) hidden to GND, 15 GND (power) hidden to GND, 16 VDD (power) hidden to VDD
part A pins: 2 CX/RX, 3 ~{CLR} (in), 4 A (in), 5 B (in), 6 Q (out), 7 ~{Q} (out)
part B pins: 9 ~{Q} (out), 10 Q (out), 11 B (in), 12 A (in), 13 ~{CLR} (in), 14 CX/RX

## MC33030
designator U?
DC Servo Motor Controller/Driver; Published: 17-Jul-2002; LatestRevisionDate: 13-Apr-2006; LatestRevisionNote: IPC-7351 Footprint Added.; DatasheetVersion: 1996; PackageVersion: 1996; PackageReference: 751G-02; Publisher: Altium Limited; PackageDescription: 16-Pin Small Outline Integrated Circuit 1.27 mm Pitch; ComponentLink1Description: Manufacturer Link; ComponentLink1URL: http://www.onsemi.com/site/products/parametrics/0,4446,407,00.html; ComponentLink2Description: Datasheet; ComponentLink2URL: http://www.onsemi.com/pub/Collateral/MC33030-D.PDF
footprint SO16L (SOIC, 16-Leads, Body 10.30x7.50mm, Pitch 1.27mm, IPC Medium Density)
footprint DIP16
pins: 1 REF IN (in), 2 REF FILT (in), 3 FILT/FB (io), 4 GND (power), 5 GND (power), 6 ERR OUT (out), 7 ERR IN- (in), 8 ERR IN+ (in), 9 ERR FILT IN (in), 10 DRV OUTB (out), 11 VDD (power), 12 GND (power), 13 GND (power), 14 DRV OUTA (out), 15 OV IREF (in), 16 OV IDLY (in)

## MC33039
designator U?
Closed-Loop Brushless Motor Adapter; Published: 17-Jul-2002; LatestRevisionDate: 06-Jun-2005; LatestRevisionNote: Stylized 3D Model Added.; DatasheetVersion: 1988; PackageReference: 626-05; Publisher: Altium Limited; PackageDescription: DIP; 8 Leads; Row Spacing 7.62 mm; Pitch 2.54 mm; ComponentLink1Description: Manufacturer Link; ComponentLink1URL: http://www.onsemi.com/site/products/parametrics/0,4446,407,00.html; ComponentLink2Description: Datasheet; ComponentLink2URL: http://www.onsemi.com/pub/Collateral/MC33039-D.PDF
footprint DIP8 (DIP, 8-Leads, Row Spacing 7.62mm, Pitch 2.54mm, Body 9.91x6.73mm)
pins: 1 phi C (in), 2 phi B (in), 3 phi A (in), 4 phi ~{A} (in), 5 FOUT (out), 6 RT/CT, 7 GND (power), 8 VDD (power)
text: F; A; B; C
